# Altium footprint library my Library.PcbLib: 1247 footprints (part 59 of 78)
Each footprint in its own frame and in the unit in brackets; x right, y up, seen from the top. Pads: shape width x height; smd on the part's side, far side on the other; paste and mask are expansions set on the pad; w line width, h text height; cw(c..) or ccw(c..) is an arc to the next point about the centre after c.
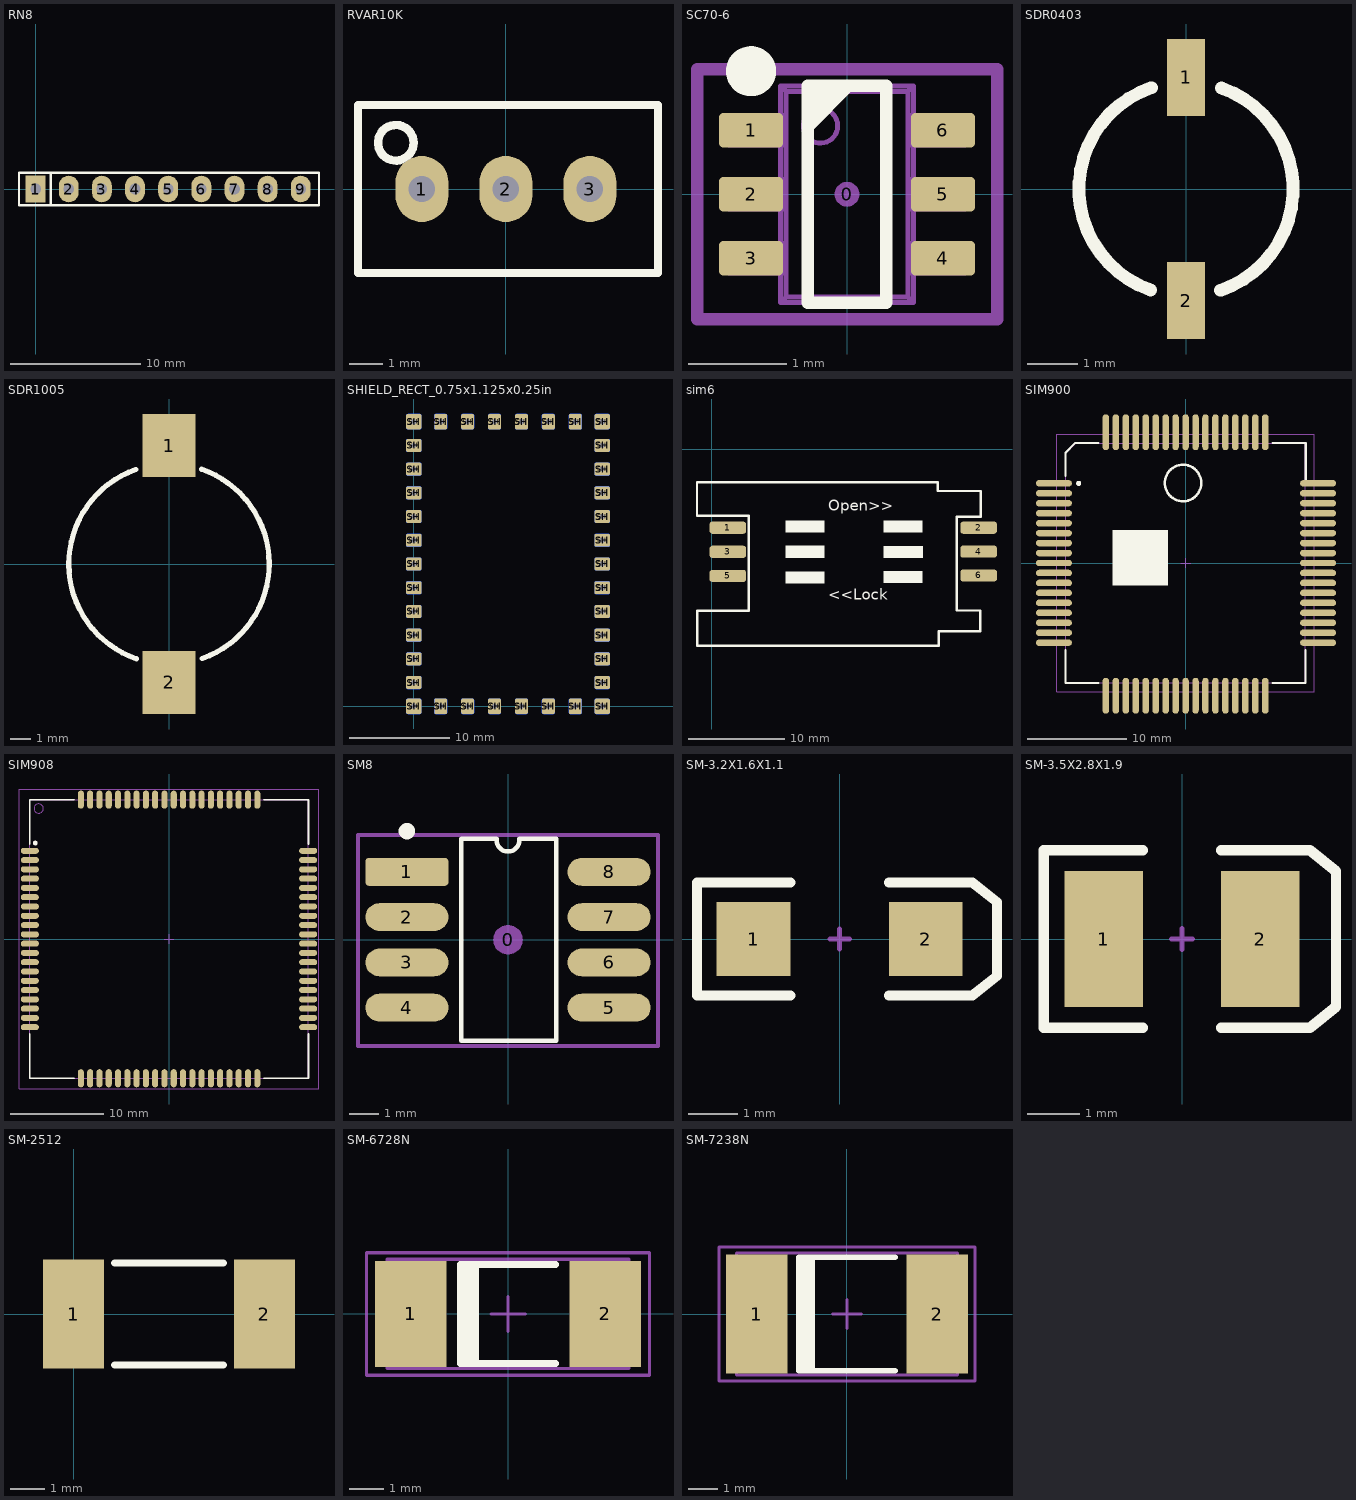
[diagram p58: the footprints below, top view; thin cyan lines are the x and y axes]

## RN8 [mil] "R SIP8, 9 Pin"
height 200
pads (9):
  rect 60x80 hole 32: 1(0,0)
  oval 60x80 hole 32: 2(100,0) 3(200,0) 4(300,0) 5(400,0) 6(500,0) 7(600,0) 8(700,0) 9(800,0)
Top Overlay:
  lines w7: 46,-49 46,47 ; -50,-49 -50,49 855,49 855,-49 -50,-49
3D body "SW3dPS-Resistor Networks-1.STEP": height 259.29, standoff -75.35, extent -42.91,-26.21 842.91,23

## RVAR10K [mm] "Bien tro vi chinh"
pads (3):
  oval 1.6x2 hole 0.8: 1(-2.54,0) 2(0,0) 3(2.54,0)
Top Overlay:
  circle w0.254: c-3.327,1.397 r0.539
  lines w0.254: -4.47,-2.54 4.597,-2.54 4.597,2.54 -4.47,2.54 -4.47,-2.54
3D body "User Library-Potenciometro Vertical.step": height 12.02, standoff -5.48, extent -4.537,-2.4 4.663,2.4

## SC70-6 [mm] "SC70-6; SOT-363"
height 1.6
pads (7):
  round 0.254 on Mech15: 0(0,0)
  rrect25% 0.65x0.35 smd: 1(-0.975,0.65) 2(-0.975,0) 3(-0.975,-0.65) 4(0.975,-0.65) 5(0.975,0) 6(0.975,0.65)
Top Overlay:
  circle w0.254: c-0.975,1.25 r0.127
  region: 0.1,1.1 -0.4,0.6 -0.4,1.1
  lines w0.127: -0.4,-1.1 -0.4,1.1 0.4,1.1 0.4,-1.1 -0.4,-1.1
Mechanical 13:
  circle w0.05: c-0.27,0.695 r0.175
  lines w0.05: -1.028,-0.8 -1.028,-0.5 ; -1.028,-0.15 -1.028,0.15 ; -1.028,0.5 -1.028,0.8 ; -0.937,-0.8 -0.937,-0.5 ; -0.937,-0.15 -0.937,0.15 ; -0.937,0.5 -0.937,0.8 ; -0.925,-0.8 -0.925,-0.5 ; -0.925,-0.15 -0.925,0.15 ; -0.925,0.5 -0.925,0.8 ; 0.925,-0.8 0.925,-0.5 ; 0.925,-0.15 0.925,0.15 ; 0.925,0.5 0.925,0.8 ; 0.937,-0.8 0.937,-0.5 ; 0.937,-0.15 0.937,0.15 ; 0.937,0.5 0.937,0.8 ; 1.028,-0.8 1.028,-0.5 ; 1.028,-0.15 1.028,0.15 ; 1.028,0.5 1.028,0.8 ; -0.675,-1.1 0.675,-1.1 ; -0.675,-1.1 -0.675,1.1 ; -0.675,-1.1 -0.619,-1.044 ; -0.675,1.1 0.675,1.1 ; -0.675,1.1 -0.619,1.044 ; -0.619,-1.044 0.619,-1.044 ; -0.619,-1.044 -0.619,1.044 ; -0.619,1.044 0.619,1.044 ; 0.619,-1.044 0.675,-1.1 ; 0.619,-1.044 0.619,1.044 ; 0.619,1.044 0.675,1.1 ; 0.675,-1.1 0.675,1.1 ; -1.2,-0.8 -1.2,-0.5 -0.654,-0.5 -0.654,-0.8 -1.2,-0.8 ; -1.2,-0.15 -1.2,0.15 -0.654,0.15 -0.654,-0.15 -1.2,-0.15 ; -1.2,0.5 -1.2,0.8 -0.654,0.8 -0.654,0.5 -1.2,0.5 ; 0.654,-0.8 1.2,-0.8 1.2,-0.5 0.654,-0.5 0.654,-0.8 ; 0.654,-0.15 1.2,-0.15 1.2,0.15 0.654,0.15 0.654,-0.15 ; 0.654,0.5 1.2,0.5 1.2,0.8 0.654,0.8 0.654,0.5
Mechanical 15:
  lines w0.127: -1.524,-1.27 -1.524,1.27 1.524,1.27 1.524,-1.27 -1.524,-1.27
3D body "SOT363.STEP": height 1.1, standoff 0, extent -1.2,-1.1 1.2,1.1

## SDR0403 [mil]
pads (2):
  rect 30x60 smd: 1(0,87) 2(0,-87)
Top Overlay:
  lines w10: -27.59,-78.83 cw(c0,0) -27.01,79.03 ; 27.01,-79.03 ccw(c0,0) 27.59,78.83
3D body "User Library-Inductor SDR0403 Series.STEP": height 128.55, standoff 0.6, extent -88.58,-86.66 88.58,86.66

## SDR0805 [mm]
3D body "User Library-inductor SDR0805.STEP": height 4.57, standoff -0.73, extent -3.9,-3.9 3.9,3.9

## SDR1005 [mil]
pads (2):
  rect 100x120 smd: 1(0,225) 2(0,-225)
Top Overlay:
  lines w10: -63.37,179.54 ccw(c0,0) -61.63,-180.14 ; 61.63,180.14 cw(c0,0) 63.37,-179.54
3D body "User Library-SDR1005.STEP": height 197.45, standoff 0.6, extent -196.85,-250 196.85,250

## SHIELD_RECT_0.75x1.125x0.25in [mil] "Fotofab standard RF shield, 1.125\"x0.75\", 0.25\" tall"
height 250
pads (114):
  round 40 hole 20: SH(0,0) SH(0,92.5) SH(0,185) SH(0,277.5) SH(0,370) SH(0,462.5) SH(0,555) SH(0,647.5) SH(0,740) SH(0,832.5) SH(0,925) SH(0,1017.5) SH(0,1110) SH(105,0) SH(105,1110) SH(210,0) SH(210,1110) SH(315,0) SH(315,1110) SH(420,0) SH(420,1110) SH(525,0) SH(525,1110) SH(630,0) SH(630,1110) SH(735,0) SH(735,92.5) SH(735,185) SH(735,277.5) SH(735,370) SH(735,462.5) SH(735,555) SH(735,647.5) SH(735,740) SH(735,832.5) SH(735,925) SH(735,1017.5) SH(735,1110)
  rrect25% 60x60 smd: SH(0,0) SH(0,1110) SH(735,0) SH(735,1110)
  rrect25% 60x60 smd far side: SH(0,0) SH(0,1110) SH(735,0) SH(735,1110)
  rrect25% 60x50 smd: SH(0,92.5) SH(0,185) SH(0,277.5) SH(0,370) SH(0,462.5) SH(0,555) SH(0,647.5) SH(0,740) SH(0,832.5) SH(0,925) SH(0,1017.5) SH(735,92.5) SH(735,185) SH(735,277.5) SH(735,370) SH(735,462.5) SH(735,555) SH(735,647.5) SH(735,740) SH(735,832.5) SH(735,925) SH(735,1017.5)
  rrect25% 60x50 smd far side: SH(0,92.5) SH(0,185) SH(0,277.5) SH(0,370) SH(0,462.5) SH(0,555) SH(0,647.5) SH(0,740) SH(0,832.5) SH(0,925) SH(0,1017.5) SH(735,92.5) SH(735,185) SH(735,277.5) SH(735,370) SH(735,462.5) SH(735,555) SH(735,647.5) SH(735,740) SH(735,832.5) SH(735,925) SH(735,1017.5)
  rrect25% 50x60 smd: SH(105,0) SH(105,1110) SH(210,0) SH(210,1110) SH(315,0) SH(315,1110) SH(420,0) SH(420,1110) SH(525,0) SH(525,1110) SH(630,0) SH(630,1110)
  rrect25% 50x60 smd far side: SH(105,0) SH(105,1110) SH(210,0) SH(210,1110) SH(315,0) SH(315,1110) SH(420,0) SH(420,1110) SH(525,0) SH(525,1110) SH(630,0) SH(630,1110)
3D body "Shield box 0.75x1.125x0.25 inch.stp": height 250, standoff 0, extent -7.49,-7.49 742.51,1117.5

## sim6 [mil]
pads (6):
  rrect50% 150x50 smd: 1(65,-320) 2(1088.62,-320) 3(65,-418.43) 4(1088.62,-417.5) 5(65,-516.85) 6(1088.62,-515)
Top Overlay:
  rectangle: 700,-545.67 860,-495.67
  rectangle: 700.79,-444.49 860.79,-394.49
  rectangle: 700,-340 860,-290
  rectangle: 299.84,-548.03 459.84,-498.03
  rectangle: 299.84,-443.31 459.84,-393.31
  rectangle: 300,-340 460,-290
  lines w10: -61.02,-271.26 -61.02,-134.65 921.26,-134.65 921.26,-170.08 1097.24,-170.08 1097.24,-274.8 1000,-274.8 1000,-657.87 1095.28,-657.87 1095.28,-742.91 925.2,-742.91 925.2,-801.57 -60.63,-801.57 -60.63,-659.06 150,-659.06 150,-271.26 -61.02,-271.26
  text "<<Lock" at 475,-615 h45
  text "Open>>" at 475,-250 h45
3D body "User Library-SIM5060-6-0-26-01-A.STEP": height 102.97, standoff -26.96, extent -66.14,-806.69 1100.79,-129.53

## SIM900 [mm]
pads (68):
  oval 3.6x0.65 smd: 1(-13.21,8) 2(-13.21,7) 3(-13.21,6) 4(-13.21,5) 5(-13.21,4) 6(-13.21,3) 7(-13.21,2) 8(-13.21,1) 9(-13.21,0) 10(-13.21,-1) 11(-13.21,-2) 12(-13.21,-3) 13(-13.21,-4) 14(-13.21,-5) 15(-13.21,-6) 16(-13.21,-7) 17(-13.21,-8) 35(13.3,-8) 36(13.3,-7) 37(13.3,-6) 38(13.3,-5) 39(13.3,-4) 40(13.3,-3) 41(13.3,-2) 42(13.3,-1) 43(13.3,0) 44(13.3,1) 45(13.3,2) 46(13.3,3) 47(13.3,4) 48(13.3,5) 49(13.3,6) 50(13.3,7) 51(13.3,8)
  oval 0.65x3.6 smd: 18(-8,-13.32) 19(-7,-13.32) 20(-6,-13.32) 21(-5,-13.32) 22(-4,-13.32) 23(-3,-13.32) 24(-2,-13.32) 25(-1,-13.32) 26(0,-13.32) 27(1,-13.32) 28(2,-13.32) 29(3,-13.32) 30(4,-13.32) 31(5,-13.32) 32(6,-13.32) 33(7,-13.32) 34(8,-13.32) 52(8,13.12) 53(7,13.12) 54(6,13.12) 55(5,13.12) 56(4,13.12) 57(3,13.12) 58(2,13.12) 59(1,13.12) 60(0,13.12) 61(-1,13.12) 62(-2,13.12) 63(-3,13.12) 64(-4,13.12) 65(-5,13.12) 66(-6,13.12) 67(-7,13.12) 68(-8,13.12)
Top Overlay:
  circle w0.254: c-0.25,8.03 r1.832
  circle w0.25: c-10.725,7.99 r0.125
  rectangle: -7.35,-2.27 -1.75,3.33
  lines w0.2: -12.05,-8.725 -12.05,-12.05 -8.725,-12.05 ; -12.05,8.725 -12.05,11.05 -11.05,12.05 -8.725,12.05 ; 8.725,-12.05 12.05,-12.05 12.05,-8.725 ; 8.725,12.05 12.05,12.05
  lines w0.254: 12.05,8.03 12.05,12.03
Mechanical 13:
  lines w0.1: -12,-12 12,-12 12,12 -11,12 -12,11 -12,-12
Mechanical 15:
  lines w0.1: -0.5,0 0.5,0 ; 0,-0.5 0,0.5 ; -12.925,-12.925 12.925,-12.925 12.925,12.925 -12.925,12.925 -12.925,-12.925
3D body "User Library-GSM_SIM900.STEP": height 3, standoff 0, extent -12.01,-11.99 11.99,12.01

## SIM908 [mm]
height 3
pads (80):
  oval 1.95x0.65 smd: 1(-15,9.5) 2(-15,8.5) 3(-15,7.5) 4(-15,6.5) 5(-15,5.5) 6(-15,4.5) 7(-15,3.5) 8(-15,2.5) 9(-15,1.5) 10(-15,0.5) 11(-15,-0.5) 12(-15,-1.5) 13(-15,-2.5) 14(-15,-3.5) 15(-15,-4.5) 16(-15,-5.5) 17(-15,-6.5) 18(-15,-7.5) 19(-15,-8.5) 20(-15,-9.5) 41(14.98,-9.5) 42(14.98,-8.5) 43(14.98,-7.5) 44(14.98,-6.5) 45(14.98,-5.5) 46(14.98,-4.5) 47(14.98,-3.5) 48(14.98,-2.5) 49(14.98,-1.5) 50(14.98,-0.5) 51(14.98,0.5) 52(14.98,1.5) 53(14.98,2.5) 54(14.98,3.5) 55(14.98,4.5) 56(14.98,5.5) 57(14.98,6.5) 58(14.98,7.5) 59(14.98,8.5) 60(14.98,9.5)
  oval 0.65x1.95 smd: 21(-9.5,-15) 22(-8.5,-15) 23(-7.5,-15) 24(-6.5,-15) 25(-5.5,-15) 26(-4.5,-15) 27(-3.5,-15) 28(-2.5,-15) 29(-1.5,-15) 30(-0.5,-15) 31(0.5,-15) 32(1.5,-15) 33(2.5,-15) 34(3.5,-15) 35(4.5,-15) 36(5.5,-15) 37(6.5,-15) 38(7.5,-15) 39(8.5,-15) 40(9.5,-15) 61(9.5,15.005) 62(8.5,15.005) 63(7.5,15.005) 64(6.5,15.005) 65(5.5,15.005) 66(4.5,15.005) 67(3.5,15.005) 68(2.5,15.005) 69(1.5,15.005) 70(0.5,15.005) 71(-0.5,15.005) 72(-1.5,15.005) 73(-2.5,15.005) 74(-3.5,15.005) 75(-4.5,15.005) 76(-5.5,15.005) 77(-6.5,15.005) 78(-7.5,15.005) 79(-8.5,15.005) 80(-9.5,15.005)
Top Overlay:
  circle w0.25: c-14.405,10.335 r0.125
  lines w0.2: -15,-10.225 -15,-15 -10.225,-15 ; -15,10.225 -15,15 -10.225,15 ; 10.225,-15 15,-15 15,-10.225 ; 10.225,15 15,15 15,10.225
Mechanical 13:
  circle w0.1: c-14.05,14.05 r0.5
  lines w0.1: -15,-15 -15,15 15,15 15,-15 -15,-15
Mechanical 15:
  lines w0.1: -0.5,0 0.5,0 ; 0,-0.5 0,0.5 ; -16.145,-16.155 -16.145,16.155 16.125,16.155 16.125,-16.155 -16.145,-16.155
3D body "User Library-SIM908.STEP": height 3.22, standoff 0.02, extent -14.995,-15 15.005,15

## SM8 [mil]
pads (9):
  round 39.37 on Mech15: 0(0,0)
  rrect25% 110x37 smd: 1(-134,90)
  oval 110x37 smd: 2(-134,30) 3(-134,-30) 4(-134,-90) 5(134,-90) 6(134,-30) 7(134,30) 8(134,90)
Top Overlay:
  circle w19.68: c-134,144 r1
  lines w6: -15,132 ccw(c0,132) 15,132 ; -15,134 -29,134 -62,134 -62,-134 64,-134 64,134 15,134
Mechanical 15:
  lines w5: -198.82,-141 -198.82,139 198.82,139 198.82,-141 -198.82,-141
3D body "SM8.stp": height 66.93, standoff 0.09, extent -142.75,-129.92 142.76,129.92

## SM-3.2X1.6X1.1 [mm] "SMT LED; 2 Flat Leads"
height 1.2
pads (2):
  rect 1.5x1.5 smd: 1(-1.75,0) 2(1.75,0)
Top Overlay:
  lines w0.2: -1,-1.15 -2.9,-1.15 -2.9,1.15 -1,1.15 ; 1,-1.15 2.7,-1.15 3.2,-0.75 3.2,0.75 2.7,1.15 1,1.15
Mechanical 1:
  lines w0.1: -0.2,0 0.2,0 ; 0,-0.2 0,0.2
3D body "SW3DPS-RESISTOR 1206-DEFAULT.STEP": height 0.53, standoff -0.03, extent -1.473,-0.889 1.727,0.771

## SM-3.5X2.8X1.9 [mm] "SM LED; 2 C-Bend Leads; Body 3.5 x 2.8 x 1.9 mm, inc leads (LxWxH typ)"
height 1.9
pads (2):
  rect 1.5x2.6 smd: 1(-1.5,0) 2(1.5,0)
Top Overlay:
  lines w0.2: -0.75,-1.7 -2.65,-1.7 -2.65,1.7 -0.75,1.7 ; 0.75,-1.7 2.45,-1.7 2.95,-1.3 2.95,1.3 2.45,1.7 0.75,1.7
Mechanical 1:
  lines w0.1: -0.2,0 0.2,0 ; 0,-0.2 0,0.2

## SM-2512 [mm] "Chip Resistor; Body 6.3 x 3.2 mm (LxW typ) - C"
height 0.6
pads (2):
  rect 1.8x3.2 smd: 1(0,0) 2(5.6,0)
Top Overlay:
  lines w0.2: 1.2,-1.5 4.4,-1.5 ; 1.2,1.5 4.4,1.5
3D body "Resistor SMD 2512.step": height 0.62, standoff 0, extent -0.492,-1.575 5.827,1.626

## SM-6728N [mm] "Chip Capacitor, Body 6.7x2.8mm, IPC Medium Density"
height 3.18
pads (2):
  rect 2.1x3.1 smd: 1(-2.85,0) 2(2.85,0)
Top Overlay:
  rectangle: -1.4,-1.45 -0.85,1.45
  lines w0.2: 1.4,-1.45 -1.4,-1.45 -1.4,1.45 1.4,1.45
Mechanical 13:
  lines w0.1: -3.55,-1.6 -3.55,1.6 3.55,1.6 3.55,-1.6 -3.55,-1.6
Mechanical 15:
  lines w0.1: -0.5,0 0.5,0 ; 0,-0.5 0,0.5 ; -4.15,-1.8 -4.15,1.8 4.15,1.8 4.15,-1.8 -4.15,-1.8
3D body: height 3.18, standoff 0, extent -3.55,-1.6 3.55,1.6

## SM-7238N [mm] "Chip Capacitor, Body 7.2x3.8mm, IPC Medium Density"
height 3.18
pads (2):
  rect 2.1x4.1 smd: 1(-3.1,0) 2(3.1,0)
Top Overlay:
  rectangle: -1.65,-1.95 -1.1,1.95
  lines w0.2: 1.65,-1.95 -1.65,-1.95 -1.65,1.95 1.65,1.95
Mechanical 13:
  lines w0.1: -3.8,-2.1 3.8,-2.1 3.8,2.1 -3.8,2.1 -3.8,-2.1
Mechanical 15:
  lines w0.1: -0.5,0 0.5,0 ; 0,-0.5 0,0.5 ; -4.4,-2.3 4.4,-2.3 4.4,2.3 -4.4,2.3 -4.4,-2.3
3D body: height 3.18, standoff 0, extent -3.8,-2.1 3.8,2.1